# Altium footprint library 6-Connectors-5.PcbLib: 46 footprints (part 4 of 5)
Each footprint in its own frame and in the unit in brackets; x right, y up, seen from the top. Pads: shape width x height; smd on the part's side, far side on the other; paste and mask are expansions set on the pad; w line width, h text height; cw(c..) or ccw(c..) is an arc to the next point about the centre after c.
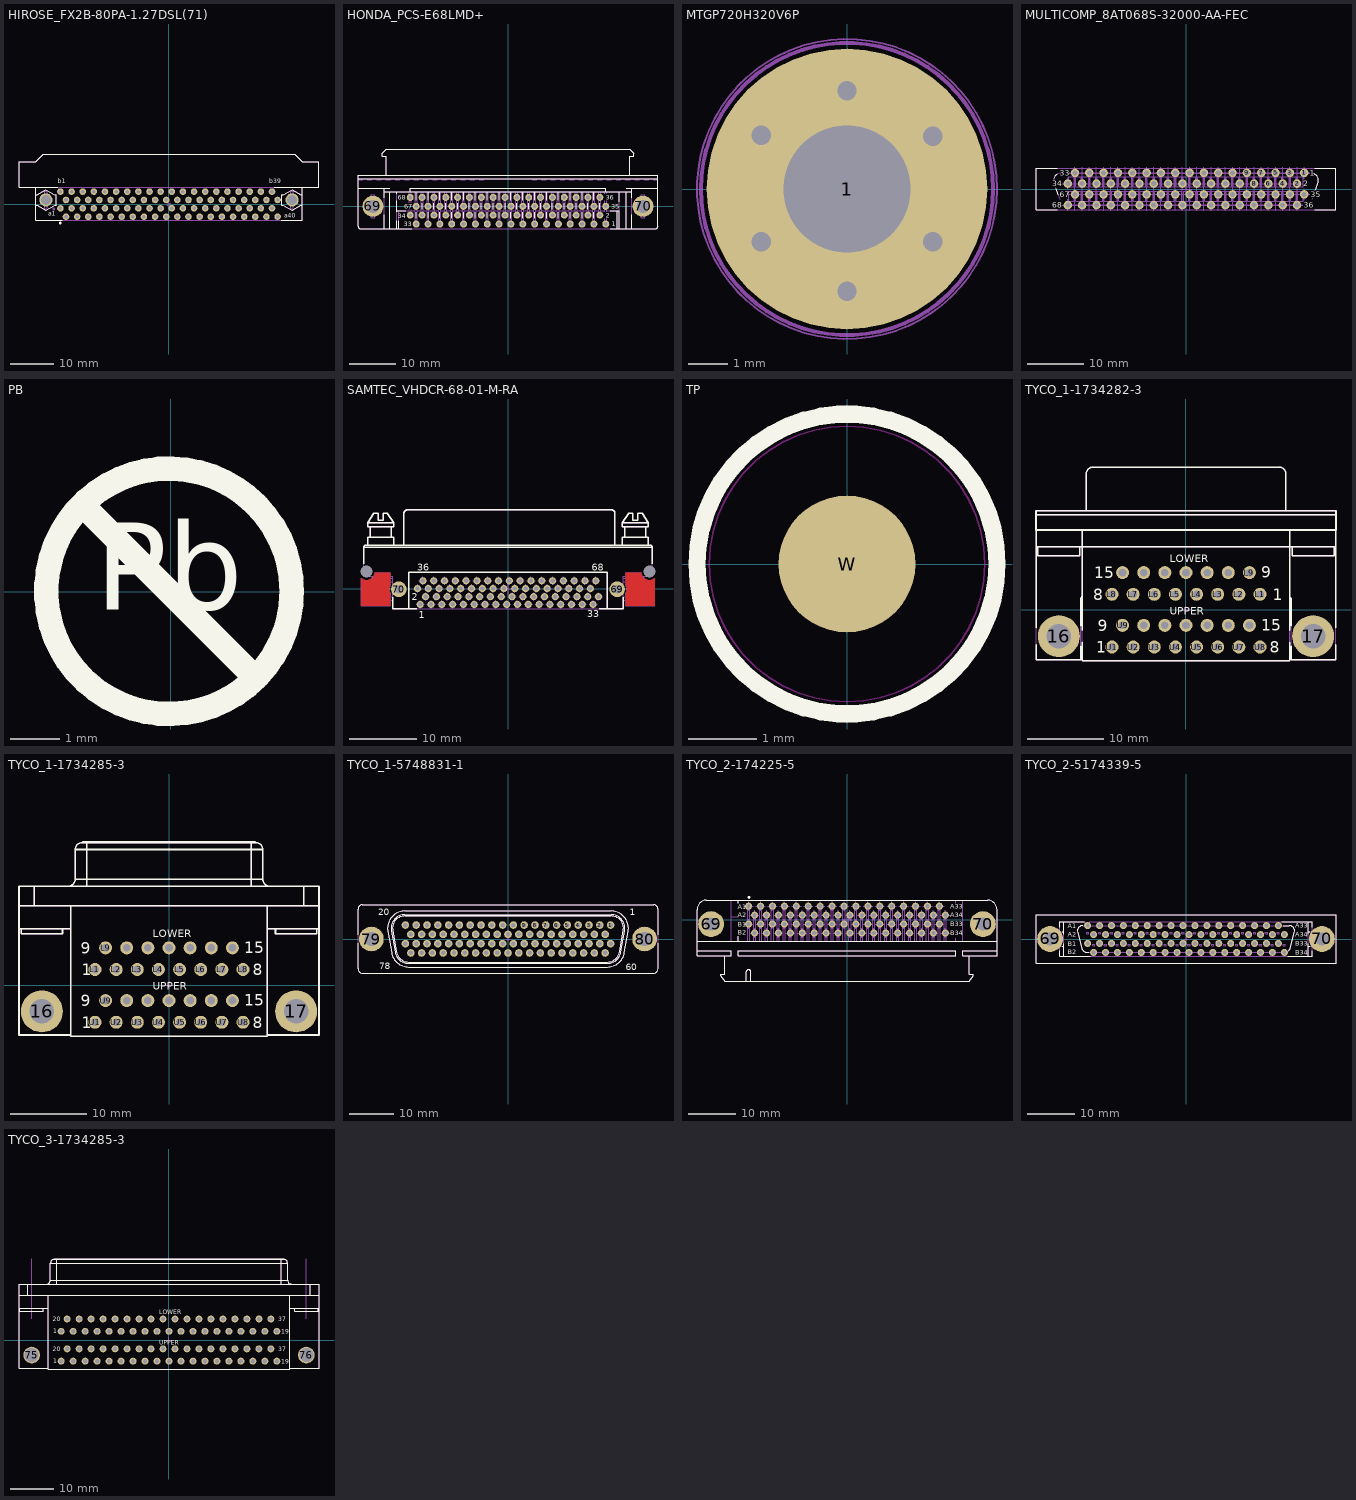
[diagram p3: the footprints below, top view; thin cyan lines are the x and y axes]

## HIROSE_FX2B-80PA-1.27DSL(71) [mm] "80 Contacts, 1.27mm Pitch, Right Angle Board to Board & Mezzanine Header with Prefixed Pin"
height 7.5
pads (82):
  round 1.5 hole 0.8: a1(-24.765,-0.953) a2(-23.495,-2.858) a3(-22.225,-0.953) a4(-20.955,-2.858) a5(-19.685,-0.953) a6(-18.415,-2.858) a7(-17.145,-0.953) a8(-15.875,-2.858) a9(-14.605,-0.953) a10(-13.335,-2.858) a11(-12.065,-0.953) a12(-10.795,-2.858) a13(-9.525,-0.953) a14(-8.255,-2.858) a15(-6.985,-0.953) a16(-5.715,-2.858) a17(-4.445,-0.953) a18(-3.175,-2.858) a19(-1.905,-0.953) a20(-0.635,-2.858) a21(0.635,-0.953) a22(1.905,-2.858) a23(3.175,-0.953) a24(4.445,-2.858) a25(5.715,-0.953) a26(6.985,-2.858) a27(8.255,-0.953) a28(9.525,-2.858) a29(10.795,-0.953) a30(12.065,-2.858) a31(13.335,-0.953) a32(14.605,-2.858) a33(15.875,-0.953) a34(17.145,-2.858) a35(18.415,-0.953) a36(19.685,-2.858) a37(20.955,-0.953) a38(22.225,-2.858) a39(23.495,-0.953) a40(24.765,-2.858) b1(-24.765,2.858) b2(-23.495,0.953) b3(-22.225,2.858) b4(-20.955,0.953) b5(-19.685,2.858) b6(-18.415,0.953) b7(-17.145,2.858) b8(-15.875,0.953) b9(-14.605,2.858) b10(-13.335,0.953) b11(-12.065,2.858) b12(-10.795,0.953) b13(-9.525,2.858) b14(-8.255,0.953) b15(-6.985,2.858) b16(-5.715,0.953) b17(-4.445,2.858) b18(-3.175,0.953) b19(-1.905,2.858) b20(-0.635,0.953) b21(0.635,2.858) b22(1.905,0.953) b23(3.175,2.858) b24(4.445,0.953) b25(5.715,2.858) b26(6.985,0.953) b27(8.255,2.858) b28(9.525,0.953) b29(10.795,2.858) b30(12.065,0.953) b31(13.335,2.858) b32(14.605,0.953) b33(15.875,2.858) b34(17.145,0.953) b35(18.415,2.858) b36(19.685,0.953) b37(20.955,2.858) b38(22.225,0.953) b39(23.495,2.858) b40(24.765,0.953)
  round 3 hole 2.3: MECH1(-28.075,0.953) MECH2(28.075,0.953)
Top Overlay:
  circle w0.3: c-24.8,-4.3 r0.15
  lines w0.2: -30.425,-0.243 -30.075,-0.243 -28.075,-1.398 -26.075,-0.243 -25.725,-0.243 -25.725,2.148 -26.075,2.148 -28.075,3.303 -30.075,2.148 -30.425,2.148 ; -30.425,3.858 -30.425,-3.643 -24.335,-3.643 ; -25.333,3.858 -34.215,3.858 -34.215,9.708 -30.375,9.708 -28.675,11.358 28.675,11.358 30.375,9.708 34.215,9.708 34.215,3.858 24.063,3.858 ; 25.605,-3.643 30.425,-3.643 30.425,3.858 ; 30.425,-0.243 30.075,-0.243 28.075,-1.398 26.075,-0.243 25.725,-0.243 25.725,2.148 26.075,2.148 28.075,3.303 30.075,2.148 30.425,2.148
  text "b39" at 22.913,4.742 h1
  text "b1" at -25.347,4.742 h1
  text "a40" at 26.288,-3.085 h1
  text "a1" at -27.487,-2.66 h1
Mechanical 8:
  drawing of 332 lines, arcs and shapes, not listed
Mechanical 14:
  circle w0.3: c-26.3,-1.1 r0.15
  lines w0.1: -30.425,-0.243 -30.075,-0.243 -28.075,-1.398 -26.075,-0.243 -25.725,-0.243 -25.725,2.148 -26.075,2.148 -28.075,3.303 -30.075,2.148 -30.425,2.148 ; -30.425,3.858 -30.425,-3.643 30.425,-3.643 30.425,3.858 ; 30.425,-0.243 30.075,-0.243 28.075,-1.398 26.075,-0.243 25.725,-0.243 25.725,2.148 26.075,2.148 28.075,3.303 30.075,2.148 30.425,2.148 ; -34.215,3.858 34.215,3.858 34.215,9.708 30.375,9.708 28.675,11.358 -28.675,11.358 -30.375,9.708 -34.215,9.708 -34.215,3.858 ; -28.325,-1.048 -27.825,-1.048 -27.825,2.953 -28.325,2.953 -28.325,-1.048 ; 27.825,-1.048 28.325,-1.048 28.325,2.953 27.825,2.953 27.825,-1.048
  text "b39" at 22.913,4.742 h1
  text "b1" at -25.347,4.742 h1
  text "a40" at 26.288,-3.085 h1
  text "a1" at -27.487,-2.66 h1
3D body "HIROSE_FX2B-80PA-1.27DSL(71).stp": height 7.5, standoff -3.3, extent -34.215,-3.642 34.215,11.358

## HONDA_PCS-E68LMD+ [mm] "1.27mm Pitch Connector, 68 Male Contacts, Right-Angle, PCS Series"
height 9.77
pads (70):
  round 1.5 hole 0.8: 1(20.955,-3.81) 2(19.685,-1.905) 3(18.415,-3.81) 4(17.145,-1.905) 5(15.875,-3.81) 6(14.605,-1.905) 7(13.335,-3.81) 8(12.065,-1.905) 9(10.795,-3.81) 10(9.525,-1.905) 11(8.255,-3.81) 12(6.985,-1.905) 13(5.715,-3.81) 14(4.445,-1.905) 15(3.175,-3.81) 16(1.905,-1.905) 17(0.635,-3.81) 18(-0.635,-1.905) 19(-1.905,-3.81) 20(-3.175,-1.905) 21(-4.445,-3.81) 22(-5.715,-1.905) 23(-6.985,-3.81) 24(-8.255,-1.905) 25(-9.525,-3.81) 26(-10.795,-1.905) 27(-12.065,-3.81) 28(-13.335,-1.905) 29(-14.605,-3.81) 30(-15.875,-1.905) 31(-17.145,-3.81) 32(-18.415,-1.905) 33(-19.685,-3.81) 34(-20.955,-1.905) 35(20.955,0) 36(19.685,1.905) 37(18.415,0) 38(17.145,1.905) 39(15.875,0) 40(14.605,1.905) 41(13.335,0) 42(12.065,1.905) 43(10.795,0) 44(9.525,1.905) 45(8.255,0) 46(6.985,1.905) 47(5.715,0) 48(4.445,1.905) 49(3.175,0) 50(1.905,1.905) 51(0.635,0) 52(-0.635,1.905) 53(-1.905,0) 54(-3.175,1.905) 55(-4.445,0) 56(-5.715,1.905) 57(-6.985,0) 58(-8.255,1.905) 59(-9.525,0) 60(-10.795,1.905) 61(-12.065,0) 62(-13.335,1.905) 63(-14.605,0) 64(-15.875,1.905) 65(-17.145,0) 66(-18.415,1.905) 67(-19.685,0) 68(-20.955,1.905)
  round 4.5 hole 2.8: 69(-28.95,0) 70(28.95,0)
Top Overlay:
  lines w0.2: -32.15,3.905 -25.355,3.905 ; -32.15,5.905 32.15,5.905 ; -26.555,-4.795 -26.555,-1.778 ; -26.555,1.778 -26.555,3.905 ; -26.555,3.105 26.555,3.105 ; -26.05,6.705 -26.05,10.705 -26.9,10.705 -26.9,11.355 -26.05,12.205 26.05,12.205 26.9,11.355 26.9,10.705 26.05,10.705 26.05,6.705 ; -25.355,-4.795 -25.355,3.105 ; -23.855,-4.795 -23.855,-3.048 ; -23.855,-1.143 -23.855,1.143 ; -23.855,-0.953 -21.907,-0.953 ; -23.855,2.667 -23.855,3.105 ; -23.455,-4.795 -23.455,-3.048 ; -21,3.105 -21,3.905 21,3.905 21,3.105 ; -20.637,-4.795 -31.65,-4.795 cw(c-31.65,-4.295) -32.15,-4.295 -32.15,6.705 32.15,6.705 32.15,-4.295 cw(c31.65,-4.295) 31.65,-4.795 21.936,-4.795 ; -19.685,-2.54 -19.685,-1.27 ; -19.685,1.27 -19.685,3.105 ; -18.415,-0.635 -18.415,0.635 ; -17.145,-2.54 -17.145,-1.27 ; -17.145,1.27 -17.145,3.105 ; -15.875,-0.635 -15.875,0.635 ; -14.605,-2.54 -14.605,-1.27 ; -14.605,1.27 -14.605,3.105 ; -13.335,-0.635 -13.335,0.635 ; -12.065,-2.54 -12.065,-1.27 ; -12.065,1.27 -12.065,3.105 ; -10.795,-0.635 -10.795,0.635 ; -9.525,-2.54 -9.525,-1.27 ; -9.525,1.27 -9.525,3.105 ; -8.255,-0.635 -8.255,0.635 ; -6.985,-2.54 -6.985,-1.27 ; -6.985,1.27 -6.985,3.105 ; -5.715,-0.635 -5.715,0.635 ; -4.445,-2.54 -4.445,-1.27 ; -4.445,1.27 -4.445,3.105 ; -3.175,-0.635 -3.175,0.635 ; -1.905,-2.54 -1.905,-1.27 ; -1.905,1.27 -1.905,3.105 ; -0.635,-0.635 -0.635,0.635 ; 0.635,-2.54 0.635,-1.27 ; 0.635,1.27 0.635,3.105 ; 1.905,-0.635 1.905,0.635 ; 3.175,-2.54 3.175,-1.27 ; 3.175,1.27 3.175,3.105 ; 4.445,-0.635 4.445,0.635 ; 5.715,-2.54 5.715,-1.27 ; 5.715,1.27 5.715,3.105 ; 6.985,-0.635 6.985,0.635 ; 8.255,-2.54 8.255,-1.27 ; 8.255,1.27 8.255,3.105 ; 9.525,-0.635 9.525,0.635 ; 10.795,-2.54 10.795,-1.27 ; 10.795,1.27 10.795,3.105 ; 12.065,-0.635 12.065,0.635 ; 13.335,-2.54 13.335,-1.27 ; 13.335,1.27 13.335,3.105 ; 14.605,-0.635 14.605,0.635 ; 15.875,-2.54 15.875,-1.27 ; 15.875,1.27 15.875,3.105 ; 17.145,-0.635 17.145,0.635 ; 18.415,-2.54 18.415,-1.27 ; 18.415,1.27 18.415,3.105 ; 19.685,-0.635 19.685,0.635 ; 21.945,-0.953 23.855,-0.953 23.855,-4.795 ; 23.455,-4.795 23.455,-0.953 ; 23.855,1.016 23.855,3.105 ; 25.355,-4.795 25.355,3.105 ; 25.355,3.905 32.15,3.905 ; 26.555,-4.795 26.555,-1.778 ; 26.555,1.778 26.555,3.905
  text "33" at -22.345,-4.31 h1
  text "1" at 22.213,-4.31 h1
  text "2" at 20.929,-2.405 h1
  text "36" at 20.976,1.405 h1
  text "67" at -22.245,-0.5 h1
  text "34" at -23.638,-2.532 h1
  text "68" at -23.615,1.405 h1
  text "35" at 22.095,-0.5 h1
Mechanical 8:
  lines w0.1: -32.15,5.705 -31.15,5.705 ; -30.15,5.705 -29.15,5.705 ; -28.15,5.705 -27.15,5.705 ; -26.15,5.705 -25.15,5.705 ; -24.15,5.705 -23.15,5.705 ; -22.15,5.705 -21.15,5.705 ; -20.15,5.705 -19.15,5.705 ; -18.15,5.705 -17.15,5.705 ; -16.15,5.705 -15.15,5.705 ; -14.15,5.705 -13.15,5.705 ; -12.15,5.705 -11.15,5.705 ; -10.15,5.705 -9.15,5.705 ; -8.15,5.705 -7.15,5.705 ; -6.15,5.705 -5.15,5.705 ; 5.15,5.705 6.15,5.705 ; 7.15,5.705 8.15,5.705 ; 9.15,5.705 10.15,5.705 ; 11.15,5.705 12.15,5.705 ; 13.15,5.705 14.15,5.705 ; 15.15,5.705 16.15,5.705 ; 17.15,5.705 18.15,5.705 ; 19.15,5.705 20.15,5.705 ; 21.15,5.705 22.15,5.705 ; 23.15,5.705 24.15,5.705 ; 25.15,5.705 26.15,5.705 ; 27.15,5.705 28.15,5.705 ; 29.15,5.705 30.15,5.705 ; 31.15,5.705 32.15,5.705
  text "PCB EDGE" at -3.714,4.705 h1
Mechanical 14:
  drawing of 189 lines, arcs and shapes, not listed
  text "33" at -22.345,-4.31 h1
  text "1" at 22.213,-4.31 h1
  text "2" at 20.929,-2.405 h1
  text "36" at 20.976,1.405 h1
  text "67" at -22.245,-0.5 h1
  text "34" at -23.638,-2.532 h1
  text "68" at -23.615,1.405 h1
  text "35" at 22.095,-0.5 h1
3D body "HONDA_PCS-E68LMD+.stp": height 9.77, standoff -3.4, extent -32.15,-4.795 32.15,12.205

## MTGP720H320V6P [mm]
pads (1):
  round 7.2 hole 3.25: 1(0,0)
via -2.2,-1.35 diameter 1 hole 0.5
via -2.2,1.375 diameter 1 hole 0.5
via 0,2.525 diameter 1 hole 0.5
via 2.2,1.35 diameter 1 hole 0.5
via 0,-2.625 diameter 1 hole 0.5
via 2.2,-1.35 diameter 1 hole 0.5
Mechanical 8:
  circle w0.1: c0,0 r2.6
  circle w0.1: c0,0 r3.75
  lines w0.1: -2.657,1.625 -2.224,1.375 ; -2.632,-1.6 -2.199,-1.35 ; -2.474,0.942 -2.224,1.375 ; -2.449,-0.917 -2.199,-1.35 ; -1.974,1.808 -2.224,1.375 ; -1.949,-1.783 -2.199,-1.35 ; -1.791,1.125 -2.224,1.375 ; -1.766,-1.1 -2.199,-1.35 ; -0.5,-2.625 0,-2.625 ; -0.5,0 0,0 ; -0.5,2.525 0,2.525 ; 0,-3.125 0,-2.625 ; 0,-2.125 0,-2.625 ; 0,-0.5 0,0 ; 0,0.5 0,0 ; 0,2.025 0,2.525 ; 0,3.025 0,2.525 ; 0.5,-2.625 0,-2.625 ; 0.5,0 0,0 ; 0.5,2.525 0,2.525 ; 1.766,-1.1 2.199,-1.35 ; 1.766,1.1 2.199,1.35 ; 1.949,-1.783 2.199,-1.35 ; 1.949,1.783 2.199,1.35 ; 2.449,-0.917 2.199,-1.35 ; 2.449,0.917 2.199,1.35 ; 2.632,-1.6 2.199,-1.35 ; 2.632,1.6 2.199,1.35
Mechanical 14:
  circle w0.1: c0,0 r3.75
Mechanical 15:
  circle w0.05: c0,0 r3.85
3D body "mtgp720h320v6p.stp": height 0.1, standoff -1.75, extent -3.627,-3.627 3.628,3.628

## MULTICOMP_8AT068S-32000-AA-FEC [mm] "68 Way,  Pitch .050\", D-Type SCSI2, Through-hole Vertical Socket"
height 8.4
pads (68):
  round 1.5 hole 0.9: 1(20.955,2.858) 2(19.685,0.953) 3(18.415,2.858) 4(17.145,0.953) 5(15.875,2.858) 6(14.605,0.953) 7(13.335,2.858) 8(12.065,0.953) 9(10.795,2.858) 10(9.525,0.953) 11(8.255,2.858) 12(6.985,0.953) 13(5.715,2.858) 14(4.445,0.953) 15(3.175,2.858) 16(1.905,0.953) 17(0.635,2.858) 18(-0.635,0.953) 19(-1.905,2.858) 20(-3.175,0.953) 21(-4.445,2.858) 22(-5.715,0.953) 23(-6.985,2.858) 24(-8.255,0.953) 25(-9.525,2.858) 26(-10.795,0.953) 27(-12.065,2.858) 28(-13.335,0.953) 29(-14.605,2.858) 30(-15.875,0.953) 31(-17.145,2.858) 32(-18.415,0.953) 33(-19.685,2.858) 34(-20.955,0.953) 35(20.955,-0.952) 36(19.685,-2.857) 37(18.415,-0.952) 38(17.145,-2.857) 39(15.875,-0.952) 40(14.605,-2.857) 41(13.335,-0.952) 42(12.065,-2.857) 43(10.795,-0.952) 44(9.525,-2.857) 45(8.255,-0.952) 46(6.985,-2.857) 47(5.715,-0.952) 48(4.445,-2.857) 49(3.175,-0.952) 50(1.905,-2.857) 51(0.635,-0.952) 52(-0.635,-2.857) 53(-1.905,-0.952) 54(-3.175,-2.857) 55(-4.445,-0.952) 56(-5.715,-2.857) 57(-6.985,-0.952) 58(-8.255,-2.857) 59(-9.525,-0.952) 60(-10.795,-2.857) 61(-12.065,-0.952) 62(-13.335,-2.857) 63(-14.605,-0.952) 64(-15.875,-2.857) 65(-17.145,-0.952) 66(-18.415,-2.857) 67(-19.685,-0.952) 68(-20.955,-2.857)
Top Overlay:
  lines w0.2: -23.443,1.89 cw(c-22.234,1.5) -22.873,2.597 ; -23.083,0.089 -22.709,-1.012 ; -22.8,-3.65 -26.6,-3.65 -26.6,3.65 -22.8,3.65 ; 22.614,2.709 cw(c22.225,1.5) 23.452,1.171 23.017,-0.106 ; 22.8,-3.65 26.6,-3.65 26.6,3.65 22.8,3.65
  text "1" at 21.975,2.358 h1
  text "2" at 20.793,0.453 h1
  text "35" at 22.139,-1.453 h1
  text "36" at 20.865,-3.358 h1
  text "34" at -23.685,0.453 h1
  text "33" at -22.386,2.358 h1
  text "67" at -22.385,-1.478 h1
  text "68" at -23.705,-3.358 h1
Mechanical 8:
  drawing of 798 lines, arcs and shapes, not listed
Mechanical 14:
  drawing of 275 lines, arcs and shapes, not listed
  text "1" at 21.975,2.358 h1
  text "2" at 20.793,0.453 h1
  text "35" at 22.139,-1.453 h1
  text "36" at 20.865,-3.358 h1
  text "34" at -23.685,0.453 h1
  text "33" at -22.386,2.358 h1
  text "67" at -22.385,-1.478 h1
  text "68" at -23.705,-3.358 h1
3D body "MULTICOMP_8AT068S-32000-AA-FEC.stp": height 8.4, standoff -3.6, extent -26.6,-3.65 26.6,3.65

## PB [mm]
Top Overlay:
  circle w0.5: c-0.031,0.013 r2.5
  lines w0.5: -1.737,1.719 1.675,-1.693
  text "Pb" at -1.536,-0.948 h3.05
3D body "pb.stp": height 0.02, standoff 0, extent -2.725,-2.725 2.725,2.725

## SAMTEC_VHDCR-68-01-M-RA [mm] "68 Positions, Pitch 0.8mm, Very Hight Density Right Angle Connector, VHDCR Series"
height 6
pads (72):
  round 1.05 hole 0.65: 1(-13,-2.35) 2(-12.2,-1.2) 3(-11.4,-2.35) 4(-10.6,-1.2) 5(-9.8,-2.35) 6(-9,-1.2) 7(-8.2,-2.35) 8(-7.4,-1.2) 9(-6.6,-2.35) 10(-5.8,-1.2) 11(-5,-2.35) 12(-4.2,-1.2) 13(-3.4,-2.35) 14(-2.6,-1.2) 15(-1.8,-2.35) 16(-1,-1.2) 17(-0.2,-2.35) 18(0.6,-1.2) 19(1.4,-2.35) 20(2.2,-1.2) 21(3,-2.35) 22(3.8,-1.2) 23(4.6,-2.35) 24(5.4,-1.2) 25(6.2,-2.35) 26(7,-1.2) 27(7.8,-2.35) 28(8.6,-1.2) 29(9.4,-2.35) 30(10.2,-1.2) 31(11,-2.35) 32(11.8,-1.2) 33(12.6,-2.35) 34(13.4,-1.2) 35(-13.4,0) 36(-12.6,1.15) 37(-11.8,0) 38(-11,1.15) 39(-10.2,0) 40(-9.4,1.15) 41(-8.6,0) 42(-7.8,1.15) 43(-7,0) 44(-6.2,1.15) 45(-5.4,0) 46(-4.6,1.15) 47(-3.8,0) 48(-3,1.15) 49(-2.2,0) 50(-1.4,1.15) 51(-0.6,0) 52(0.2,1.15) 53(1,0) 54(1.8,1.15) 55(2.6,0) 56(3.4,1.15) 57(4.2,0) 58(5,1.15) 59(5.8,0) 60(6.6,1.15) 61(7.4,0) 62(8.2,1.15) 63(9,0) 64(9.8,1.15) 65(10.6,0) 66(11.4,1.15) 67(12.2,0) 68(13,1.15)
  round 2.3 hole 1.2: 69(16.17,-0.105) 70(-16.17,-0.105)
  round 1 hole 1.8 unplated: 71(20.95,2.51) 72(-20.95,2.51)
Top Layer:
  region: 17.42,-2.557 17.42,-0.757 17.489,-0.603 17.57,-0.274 17.57,0.064 17.489,0.393 17.42,0.547 17.42,2.347 19.701,2.347 19.733,2.185 19.858,1.881 20.059,1.619 20.321,1.419 20.625,1.293 20.952,1.25 21.279,1.294 21.583,1.421 21.72,1.513 21.72,-2.557
  region: -17.42,-2.557 -17.42,-0.757 -17.489,-0.603 -17.57,-0.274 -17.57,0.064 -17.489,0.393 -17.42,0.547 -17.42,2.347 -19.701,2.347 -19.733,2.185 -19.858,1.881 -20.059,1.619 -20.321,1.419 -20.625,1.293 -20.952,1.25 -21.279,1.294 -21.583,1.421 -21.72,1.513 -21.72,-2.557
Top Overlay:
  lines w0.2: -21.35,6.144 21.35,6.094 ; -21.349,3.705 -21.348,6.144 cw(c-21.048,6.144) -21.048,6.444 21.05,6.444 cw(c21.05,6.144) 21.35,6.144 21.35,3.705 ; -20.797,6.444 -20.797,7.584 -16.903,7.584 ; -20.4,7.584 -20.4,9.114 ; -17.845,11.124 -18.49,11.124 -18.49,10.124 -19.21,10.124 -19.21,11.124 -19.855,11.124 -20.765,9.714 ; -17.845,11.124 -16.938,9.714 ; -17.302,9.114 -17.3,7.584 ; -17.1,-1.314 -17.1,-3.005 -13.5,-3.005 ; -16.903,6.444 -16.9,7.584 ; -15.408,6.444 -15.408,11.144 cw(c-14.908,11.144) -14.908,11.644 15.325,11.644 cw(c15.325,11.144) 15.825,11.144 15.825,6.444 ; -14.7,-3.005 -14.7,2.435 14.7,2.435 14.7,-3.005 ; 13.5,-3.005 17.1,-3.005 17.1,-1.314 ; 16.9,7.584 16.903,6.444 ; 16.903,7.584 20.797,7.584 20.797,6.444 ; 17.3,7.584 17.302,9.114 ; 17.845,11.124 16.938,9.714 ; 17.845,11.124 18.49,11.124 18.49,10.124 19.21,10.124 19.21,11.124 19.855,11.124 20.765,9.714 ; 20.4,7.584 20.4,9.114 ; -20.765,9.714 -16.938,9.714 ; -20.765,9.714 -20.765,9.114 -16.938,9.114 -16.938,9.714 ; 16.938,9.714 20.765,9.714 ; 16.938,9.714 16.938,9.114 20.765,9.114 20.765,9.714
  text "1" at -13.204,-4.373 h1
  text "2" at -14.259,-1.706 h1
  text "36" at -13.425,2.611 h1
  text "33" at 11.725,-4.246 h1
  text "68" at 12.411,2.611 h1
Top Solder:
  region: -21.847,-2.684 -17.293,-2.684 -17.293,-0.725 -17.362,-0.579 -17.443,-0.266 -17.443,0.056 -17.362,0.369 -17.293,0.515 -17.293,2.474 -19.818,2.474 -19.827,2.359 -19.881,2.134 -19.98,1.925 -20.119,1.74 -20.292,1.588 -20.493,1.473 -20.713,1.402 -20.943,1.377 -21.173,1.399 -21.394,1.468 -21.596,1.579 -21.772,1.73 -21.847,1.818
  region: 17.293,-2.684 21.847,-2.684 21.847,1.818 21.772,1.73 21.596,1.579 21.394,1.468 21.173,1.399 20.943,1.377 20.713,1.402 20.493,1.473 20.292,1.588 20.119,1.74 19.98,1.925 19.881,2.134 19.827,2.359 19.818,2.474 17.293,2.474 17.293,0.515 17.362,0.369 17.443,0.056 17.443,-0.266 17.362,-0.579 17.293,-0.725
Mechanical 8:
  drawing of 614 lines, arcs and shapes, not listed
Mechanical 14:
  lines w0.1: -21.35,6.144 21.35,6.094 ; -20.797,6.444 -20.797,7.584 -16.903,7.584 ; -20.4,7.584 -20.4,9.114 ; -17.845,11.124 -18.49,11.124 -18.49,10.124 -19.21,10.124 -19.21,11.124 -19.855,11.124 -20.765,9.714 ; -17.845,11.124 -16.938,9.714 ; -17.302,9.114 -17.3,7.584 ; -17.1,-1.755 -19.275,-1.755 cw(c-19.275,-1.255) -19.775,-1.255 -19.775,1.045 cw(c-19.275,1.045) -19.275,1.545 -17.1,1.545 ; -17.1,-1.205 -19.075,-1.205 cw(c-19.075,-1.005) -19.275,-1.005 -19.275,0.795 cw(c-19.075,0.795) -19.075,0.995 -17.1,0.995 ; -16.903,6.444 -16.9,7.584 ; -15.408,6.444 -15.408,11.144 cw(c-14.908,11.144) -14.908,11.644 15.325,11.644 cw(c15.325,11.144) 15.825,11.144 15.825,6.444 ; -14.7,-3.005 -14.7,2.435 14.7,2.435 14.7,-3.005 17.1,-3.005 ; 16.9,7.584 16.903,6.444 ; 16.903,7.584 20.797,7.584 20.797,6.444 ; 17.1,-1.755 19.275,-1.755 ccw(c19.275,-1.255) 19.775,-1.255 19.775,1.045 ccw(c19.275,1.045) 19.275,1.545 17.1,1.545 ; 17.1,-1.205 19.075,-1.205 ccw(c19.075,-1.005) 19.275,-1.005 19.275,0.795 ccw(c19.075,0.795) 19.075,0.995 17.1,0.995 ; 17.3,7.584 17.302,9.114 ; 17.845,11.124 16.938,9.714 ; 17.845,11.124 18.49,11.124 18.49,10.124 19.21,10.124 19.21,11.124 19.855,11.124 20.765,9.714 ; 20.4,7.584 20.4,9.114 ; -20.765,9.714 -16.938,9.714 ; -20.765,9.714 -20.765,9.114 -16.938,9.114 -16.938,9.714 ; 16.938,9.714 20.765,9.714 ; 16.938,9.714 16.938,9.114 20.765,9.114 20.765,9.714 ; 17.1,-3.005 17.1,1.81 21.35,1.81 21.35,6.144 ccw(c21.05,6.144) 21.05,6.444 -21.048,6.444 ccw(c-21.048,6.144) -21.348,6.144 -21.35,1.81 -17.1,1.81 -17.1,-3.005 17.1,-3.005
  text "1" at -13.204,-4.373 h1
  text "2" at -14.259,-1.706 h1
  text "36" at -13.425,2.611 h1
  text "33" at 11.725,-4.246 h1
  text "68" at 12.411,2.611 h1
3D body "SAMTEC_VHDCR-68-01-M-RA.stp": height 6, standoff -3.7, extent -21.35,-3.005 21.35,11.644

## TP [mm]
height 11.7
pads (1):
  round 2 smd mask+1: W(0,0)
Top Overlay:
  circle w0.254: c0,0 r2.195
Keep-Out Layer:
  circle w0.025: c0,0 r2.017
3D body "1_016-1_016-3_tp.stp": height 0.02, standoff 0, extent -1.5,-1.5 1.5,1.5
